# Altium integrated library WCAP-ATUL_rev15a.intlib: 117 symbols (part 2 of 2)
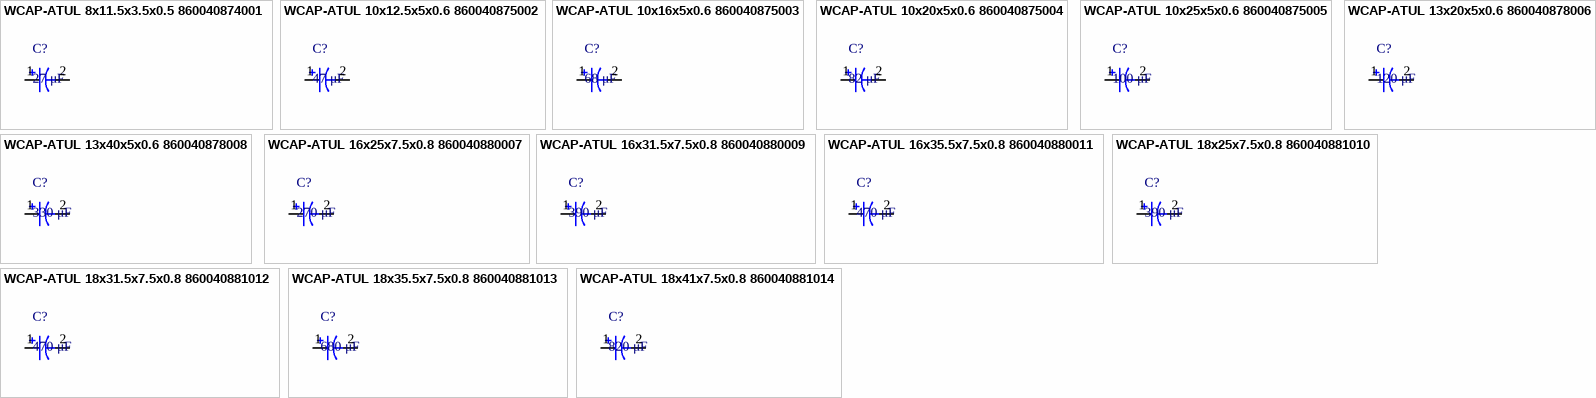
[diagram p7: symbols WCAP-ATUL 8x11.5x3.5x0.5 860040874001 to WCAP-ATUL 18x41x7.5x0.8 860040881014]

## WCAP-ATUL 8x11.5x3.5x0.5 860040874001
designator C?, comment 27 μF
WCAP-ATUL Aluminum Electrolytic Capacitors , 27 μF; + / - 20%; 100 V , 8 x 11,5; Manufacturer: Wurth Elektronik; partNo: 860040874001; E-mail: libraries@we-online.com; Characteristics: Aluminum Electrolytic Capacitor;Recommended soldering: Wave;Operating temperature: –40 °C to +105 °C;Minimized ESR and long life product series;Load life: 4000–10000 h @ +105 °C; ComponentLink1Description: Manufacturer; ComponentLink1URL: http://www.we-online.com; ComponentLink2Description: Datasheet; ComponentLink2URL: http://katalog.we-online.de/pbs/datasheet/860040874001.pdf; Created by: Karrer Zheng; Created Date: 5/13/2015; Capacitance: 27 μF; Application: Applied to high frequency secondary side output filter loop, general switching power supply, DC-DC converter, AC-DC converter, adapter, charger, TV, VCR, DC motor circuit filter, LCD TV digital audio, digital TV, digital camera, digital video camera, satellite receiver and etc.
footprint WCAP-ATUL 8x11.5x3.5x0.5
pins: 1, 2

## WCAP-ATUL 10x12.5x5x0.6 860040875002
designator C?, comment 47 μF
WCAP-ATUL Aluminum Electrolytic Capacitors , 47 μF; + / - 20%; 100 V , 10 x 12,5; Manufacturer: Wurth Elektronik; partNo: 860040875002; E-mail: libraries@we-online.com; Characteristics: Aluminum Electrolytic Capacitor;Recommended soldering: Wave;Operating temperature: –40 °C to +105 °C;Minimized ESR and long life product series;Load life: 4000–10000 h @ +105 °C; ComponentLink1Description: Manufacturer; ComponentLink1URL: http://www.we-online.com; ComponentLink2Description: Datasheet; ComponentLink2URL: http://katalog.we-online.de/pbs/datasheet/860040875002.pdf; Created by: Karrer Zheng; Created Date: 5/13/2015; Capacitance: 47 μF; Application: Applied to high frequency secondary side output filter loop, general switching power supply, DC-DC converter, AC-DC converter, adapter, charger, TV, VCR, DC motor circuit filter, LCD TV digital audio, digital TV, digital camera, digital video camera, satellite receiver and etc.
footprint WCAP-ATUL 10x12.5x5x0.6
pins: 1, 2

## WCAP-ATUL 10x16x5x0.6 860040875003
designator C?, comment 68 μF
WCAP-ATUL Aluminum Electrolytic Capacitors , 68 μF; + / - 20%; 100 V , 10 x 16; Manufacturer: Wurth Elektronik; partNo: 860040875003; E-mail: libraries@we-online.com; Characteristics: Aluminum Electrolytic Capacitor;Recommended soldering: Wave;Operating temperature: –40 °C to +105 °C;Minimized ESR and long life product series;Load life: 4000–10000 h @ +105 °C; ComponentLink1Description: Manufacturer; ComponentLink1URL: http://www.we-online.com; ComponentLink2Description: Datasheet; ComponentLink2URL: http://katalog.we-online.de/pbs/datasheet/860040875003.pdf; Created by: Karrer Zheng; Created Date: 5/13/2015; Capacitance: 68 μF; Application: Applied to high frequency secondary side output filter loop, general switching power supply, DC-DC converter, AC-DC converter, adapter, charger, TV, VCR, DC motor circuit filter, LCD TV digital audio, digital TV, digital camera, digital video camera, satellite receiver and etc.
footprint WCAP-ATUL 10x16x5x0.6
pins: 1, 2

## WCAP-ATUL 10x20x5x0.6 860040875004
designator C?, comment 82 μF
WCAP-ATUL Aluminum Electrolytic Capacitors , 82 μF; + / - 20%; 100 V , 10 x 20; Manufacturer: Wurth Elektronik; partNo: 860040875004; E-mail: libraries@we-online.com; Characteristics: Aluminum Electrolytic Capacitor;Recommended soldering: Wave;Operating temperature: –40 °C to +105 °C;Minimized ESR and long life product series;Load life: 4000–10000 h @ +105 °C; ComponentLink1Description: Manufacturer; ComponentLink1URL: http://www.we-online.com; ComponentLink2Description: Datasheet; ComponentLink2URL: http://katalog.we-online.de/pbs/datasheet/860040875004.pdf; Created by: Karrer Zheng; Created Date: 5/13/2015; Capacitance: 82 μF; Application: Applied to high frequency secondary side output filter loop, general switching power supply, DC-DC converter, AC-DC converter, adapter, charger, TV, VCR, DC motor circuit filter, LCD TV digital audio, digital TV, digital camera, digital video camera, satellite receiver and etc.
footprint WCAP-ATUL 10x20x5x0.6
pins: 1, 2

## WCAP-ATUL 10x25x5x0.6 860040875005
designator C?, comment 100 μF
WCAP-ATUL Aluminum Electrolytic Capacitors , 100 μF; + / - 20%; 100 V , 10 x 25; Manufacturer: Wurth Elektronik; partNo: 860040875005; E-mail: libraries@we-online.com; Characteristics: Aluminum Electrolytic Capacitor;Recommended soldering: Wave;Operating temperature: –40 °C to +105 °C;Minimized ESR and long life product series;Load life: 4000–10000 h @ +105 °C; ComponentLink1Description: Manufacturer; ComponentLink1URL: http://www.we-online.com; ComponentLink2Description: Datasheet; ComponentLink2URL: http://katalog.we-online.de/pbs/datasheet/860040875005.pdf; Created by: Karrer Zheng; Created Date: 5/13/2015; Capacitance: 100 μF; Application: Applied to high frequency secondary side output filter loop, general switching power supply, DC-DC converter, AC-DC converter, adapter, charger, TV, VCR, DC motor circuit filter, LCD TV digital audio, digital TV, digital camera, digital video camera, satellite receiver and etc.
footprint WCAP-ATUL 10x25x5x0.6
pins: 1, 2

## WCAP-ATUL 13x20x5x0.6 860040878006
designator C?, comment 120 μF
WCAP-ATUL Aluminum Electrolytic Capacitors , 120 μF; + / - 20%; 100 V , 13 x 20; Manufacturer: Wurth Elektronik; partNo: 860040878006; E-mail: libraries@we-online.com; Characteristics: Aluminum Electrolytic Capacitor;Recommended soldering: Wave;Operating temperature: –40 °C to +105 °C;Minimized ESR and long life product series;Load life: 4000–10000 h @ +105 °C; ComponentLink1Description: Manufacturer; ComponentLink1URL: http://www.we-online.com; ComponentLink2Description: Datasheet; ComponentLink2URL: http://katalog.we-online.de/pbs/datasheet/860040878006.pdf; Created by: Karrer Zheng; Created Date: 5/13/2015; Capacitance: 120 μF; Application: Applied to high frequency secondary side output filter loop, general switching power supply, DC-DC converter, AC-DC converter, adapter, charger, TV, VCR, DC motor circuit filter, LCD TV digital audio, digital TV, digital camera, digital video camera, satellite receiver and etc.
footprint WCAP-ATUL 13x20x5x0.6
pins: 1, 2

## WCAP-ATUL 13x40x5x0.6 860040878008
designator C?, comment 330 μF
WCAP-ATUL Aluminum Electrolytic Capacitors , 330 μF; + / - 20%; 100 V , 13 x 40; Manufacturer: Wurth Elektronik; partNo: 860040878008; E-mail: libraries@we-online.com; Characteristics: Aluminum Electrolytic Capacitor;Recommended soldering: Wave;Operating temperature: –40 °C to +105 °C;Minimized ESR and long life product series;Load life: 4000–10000 h @ +105 °C; ComponentLink1Description: Manufacturer; ComponentLink1URL: http://www.we-online.com; ComponentLink2Description: Datasheet; ComponentLink2URL: http://katalog.we-online.de/pbs/datasheet/860040878008.pdf; Created by: Karrer Zheng; Created Date: 5/13/2015; Capacitance: 330 μF; Application: Applied to high frequency secondary side output filter loop, general switching power supply, DC-DC converter, AC-DC converter, adapter, charger, TV, VCR, DC motor circuit filter, LCD TV digital audio, digital TV, digital camera, digital video camera, satellite receiver and etc.
footprint WCAP-ATUL 13x40x5x0.6
pins: 1, 2

## WCAP-ATUL 16x25x7.5x0.8 860040880007
designator C?, comment 270 μF
WCAP-ATUL Aluminum Electrolytic Capacitors , 270 μF; + / - 20%; 100 V , 16 x 25; Manufacturer: Wurth Elektronik; partNo: 860040880007; E-mail: libraries@we-online.com; Characteristics: Aluminum Electrolytic Capacitor;Recommended soldering: Wave;Operating temperature: –40 °C to +105 °C;Minimized ESR and long life product series;Load life: 4000–10000 h @ +105 °C; ComponentLink1Description: Manufacturer; ComponentLink1URL: http://www.we-online.com; ComponentLink2Description: Datasheet; ComponentLink2URL: http://katalog.we-online.de/pbs/datasheet/860040880007.pdf; Created by: Karrer Zheng; Created Date: 5/13/2015; Capacitance: 270 μF; Application: Applied to high frequency secondary side output filter loop, general switching power supply, DC-DC converter, AC-DC converter, adapter, charger, TV, VCR, DC motor circuit filter, LCD TV digital audio, digital TV, digital camera, digital video camera, satellite receiver and etc.
footprint WCAP-ATUL 16x25x7.5x0.8
pins: 1, 2

## WCAP-ATUL 16x31.5x7.5x0.8 860040880009
designator C?, comment 390 μF
WCAP-ATUL Aluminum Electrolytic Capacitors , 390 μF; + / - 20%; 100 V , 16 x 31,5; Manufacturer: Wurth Elektronik; partNo: 860040880009; E-mail: libraries@we-online.com; Characteristics: Aluminum Electrolytic Capacitor;Recommended soldering: Wave;Operating temperature: –40 °C to +105 °C;Minimized ESR and long life product series;Load life: 4000–10000 h @ +105 °C; ComponentLink1Description: Manufacturer; ComponentLink1URL: http://www.we-online.com; ComponentLink2Description: Datasheet; ComponentLink2URL: http://katalog.we-online.de/pbs/datasheet/860040880009.pdf; Created by: Karrer Zheng; Created Date: 5/13/2015; Capacitance: 390 μF; Application: Applied to high frequency secondary side output filter loop, general switching power supply, DC-DC converter, AC-DC converter, adapter, charger, TV, VCR, DC motor circuit filter, LCD TV digital audio, digital TV, digital camera, digital video camera, satellite receiver and etc.
footprint WCAP-ATUL 16x31.5x7.5x0.8
pins: 1, 2

## WCAP-ATUL 16x35.5x7.5x0.8 860040880011
designator C?, comment 470 μF
WCAP-ATUL Aluminum Electrolytic Capacitors , 470 μF; + / - 20%; 100 V , 16 x 35,5; Manufacturer: Wurth Elektronik; partNo: 860040880011; E-mail: libraries@we-online.com; Characteristics: Aluminum Electrolytic Capacitor;Recommended soldering: Wave;Operating temperature: –40 °C to +105 °C;Minimized ESR and long life product series;Load life: 4000–10000 h @ +105 °C; ComponentLink1Description: Manufacturer; ComponentLink1URL: http://www.we-online.com; ComponentLink2Description: Datasheet; ComponentLink2URL: http://katalog.we-online.de/pbs/datasheet/860040880011.pdf; Created by: Karrer Zheng; Created Date: 5/13/2015; Capacitance: 470 μF; Application: Applied to high frequency secondary side output filter loop, general switching power supply, DC-DC converter, AC-DC converter, adapter, charger, TV, VCR, DC motor circuit filter, LCD TV digital audio, digital TV, digital camera, digital video camera, satellite receiver and etc.
footprint WCAP-ATUL 16x35.5x7.5x0.8
pins: 1, 2

## WCAP-ATUL 18x25x7.5x0.8 860040881010
designator C?, comment 390 μF
WCAP-ATUL Aluminum Electrolytic Capacitors , 390 μF; + / - 20%; 100 V , 18 x 25; Manufacturer: Wurth Elektronik; partNo: 860040881010; E-mail: libraries@we-online.com; Characteristics: Aluminum Electrolytic Capacitor;Recommended soldering: Wave;Operating temperature: –40 °C to +105 °C;Minimized ESR and long life product series;Load life: 4000–10000 h @ +105 °C; ComponentLink1Description: Manufacturer; ComponentLink1URL: http://www.we-online.com; ComponentLink2Description: Datasheet; ComponentLink2URL: http://katalog.we-online.de/pbs/datasheet/860040881010.pdf; Created by: Karrer Zheng; Created Date: 5/13/2015; Capacitance: 390 μF; Application: Applied to high frequency secondary side output filter loop, general switching power supply, DC-DC converter, AC-DC converter, adapter, charger, TV, VCR, DC motor circuit filter, LCD TV digital audio, digital TV, digital camera, digital video camera, satellite receiver and etc.
footprint WCAP-ATUL 18x25x7.5x0.8
pins: 1, 2

## WCAP-ATUL 18x31.5x7.5x0.8 860040881012
designator C?, comment 470 μF
WCAP-ATUL Aluminum Electrolytic Capacitors , 470 μF; + / - 20%; 100 V , 18 x 31,5; Manufacturer: Wurth Elektronik; partNo: 860040881012; E-mail: libraries@we-online.com; Characteristics: Aluminum Electrolytic Capacitor;Recommended soldering: Wave;Operating temperature: –40 °C to +105 °C;Minimized ESR and long life product series;Load life: 4000–10000 h @ +105 °C; ComponentLink1Description: Manufacturer; ComponentLink1URL: http://www.we-online.com; ComponentLink2Description: Datasheet; ComponentLink2URL: http://katalog.we-online.de/pbs/datasheet/860040881012.pdf; Created by: Karrer Zheng; Created Date: 5/13/2015; Capacitance: 470 μF; Application: Applied to high frequency secondary side output filter loop, general switching power supply, DC-DC converter, AC-DC converter, adapter, charger, TV, VCR, DC motor circuit filter, LCD TV digital audio, digital TV, digital camera, digital video camera, satellite receiver and etc.
footprint WCAP-ATUL 18x31.5x7.5x0.8
pins: 1, 2

## WCAP-ATUL 18x35.5x7.5x0.8 860040881013
designator C?, comment 680 μF
WCAP-ATUL Aluminum Electrolytic Capacitors , 680 μF; + / - 20%; 100 V , 18 x 35,5; Manufacturer: Wurth Elektronik; partNo: 860040881013; E-mail: libraries@we-online.com; Characteristics: Aluminum Electrolytic Capacitor;Recommended soldering: Wave;Operating temperature: –40 °C to +105 °C;Minimized ESR and long life product series;Load life: 4000–10000 h @ +105 °C; ComponentLink1Description: Manufacturer; ComponentLink1URL: http://www.we-online.com; ComponentLink2Description: Datasheet; ComponentLink2URL: http://katalog.we-online.de/pbs/datasheet/860040881013.pdf; Created by: Karrer Zheng; Created Date: 5/13/2015; Capacitance: 680 μF; Application: Applied to high frequency secondary side output filter loop, general switching power supply, DC-DC converter, AC-DC converter, adapter, charger, TV, VCR, DC motor circuit filter, LCD TV digital audio, digital TV, digital camera, digital video camera, satellite receiver and etc.
footprint WCAP-ATUL 18x35.5x7.5x0.8
pins: 1, 2

## WCAP-ATUL 18x41x7.5x0.8 860040881014
designator C?, comment 820 μF
WCAP-ATUL Aluminum Electrolytic Capacitors , 820 μF; + / - 20%; 100 V , 18 x 41; Manufacturer: Wurth Elektronik; partNo: 860040881014; E-mail: libraries@we-online.com; Characteristics: Aluminum Electrolytic Capacitor;Recommended soldering: Wave;Operating temperature: –40 °C to +105 °C;Minimized ESR and long life product series;Load life: 4000–10000 h @ +105 °C; ComponentLink1Description: Manufacturer; ComponentLink1URL: http://www.we-online.com; ComponentLink2Description: Datasheet; ComponentLink2URL: http://katalog.we-online.de/pbs/datasheet/860040881014.pdf; Created by: Karrer Zheng; Created Date: 5/13/2015; Capacitance: 820 μF; Application: Applied to high frequency secondary side output filter loop, general switching power supply, DC-DC converter, AC-DC converter, adapter, charger, TV, VCR, DC motor circuit filter, LCD TV digital audio, digital TV, digital camera, digital video camera, satellite receiver and etc.
footprint WCAP-ATUL 18x41x7.5x0.8
pins: 1, 2